# Altium footprint library 3.13-M3铜柱-散热片.PcbLib: 151 footprints (part 10 of 10)
Each footprint in its own frame and in the unit in brackets; x right, y up, seen from the top. Pads: shape width x height; smd on the part's side, far side on the other; paste and mask are expansions set on the pad; w line width, h text height; cw(c..) or ccw(c..) is an arc to the next point about the centre after c.
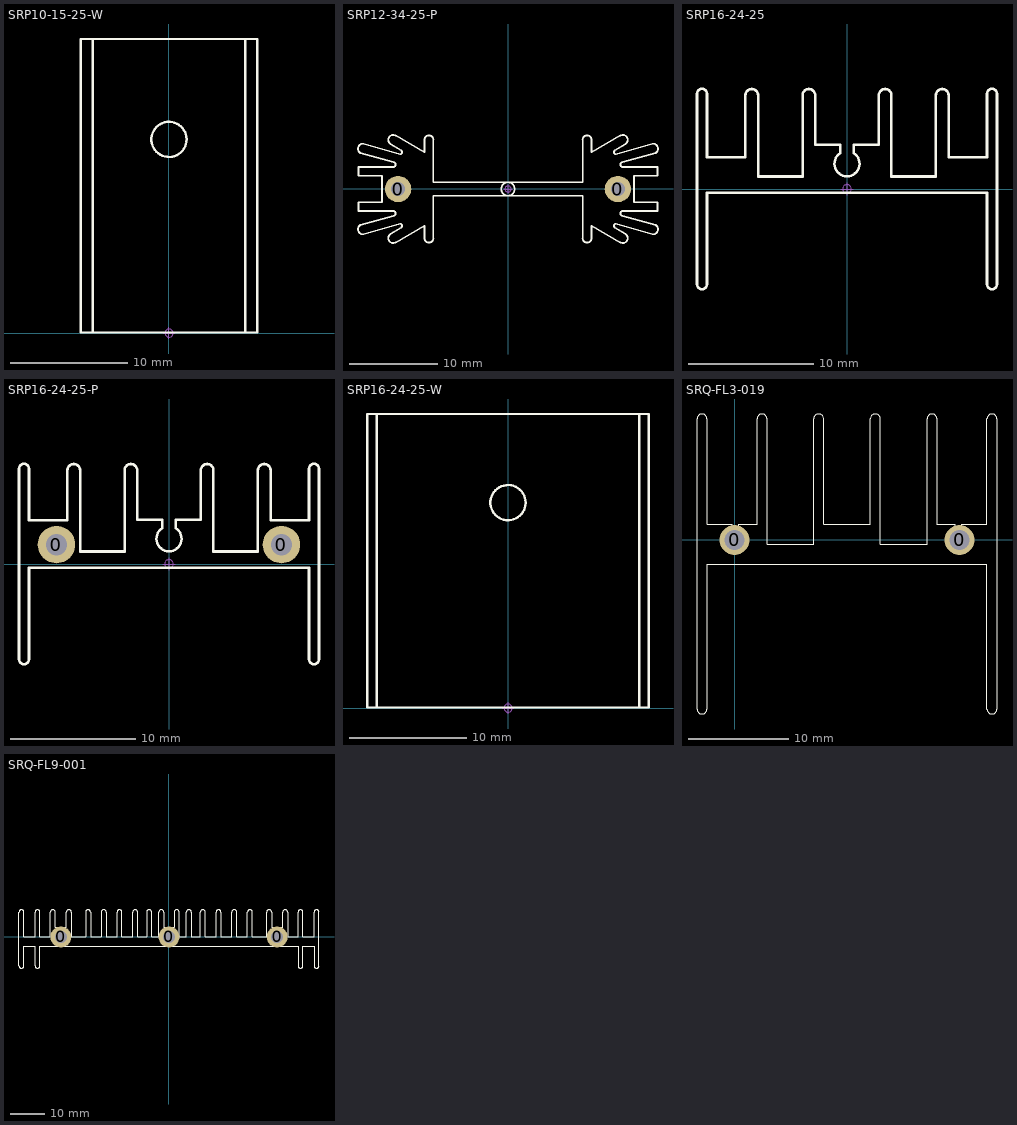
[diagram p9: the footprints below, top view; thin cyan lines are the x and y axes]

## SRP10-15-25-W [mil] "10mm*15mm*25mm(长*宽*高)"
Top Overlay:
  circle w8: c0,649.61 r59.06
  lines w8: -255.91,1.96 -255.91,984.25 ; 255.91,1.96 255.91,986.22 ; -295.27,1.96 295.28,1.96 295.28,986.22 -295.27,986.22 -295.27,1.96
Mechanical 15:
  circle w1.97: c0,0 r13.78
  lines w1.97: -19.68,0 19.68,0 ; 0,-19.68 0,19.68
3D body: height 395.67, standoff 1.97, extent -295.28,3.93 295.28,988.19

## SRP12-34-25-P [mm] "12mm*32mm*25mm(长*宽*高)"
pads (2):
  round 3 hole 1.6 unplated: 0(-12.5,-0.004) 0(12.5,-0.004)
Top Overlay:
  circle w0.203: c0,-0.004 r0.766
  lines w0.203: -14.326,-0.004 -14.326,-1.5 -17,-1.5 -17,-2.5 -13,-2.5 -13.047,-2.5 cw(c-13.059,-2.78) -13.047,-3.06 -16.802,-4.096 ccw(c-16.485,-4.576) -16.417,-5.147 -12.294,-3.95 cw(c-12.294,-4.195) -12.167,-4.404 -13.331,-5.107 ccw(c-13.056,-5.592) -12.807,-6.09 ; -14.326,0 -14.326,1.496 -17,1.496 -17,2.496 -13,2.496 -13.047,2.496 ccw(c-13.059,2.776) -13.047,3.056 -16.802,4.092 cw(c-16.485,4.572) -16.417,5.143 -12.294,3.946 ccw(c-12.294,4.191) -12.167,4.4 -13.331,5.103 cw(c-13.056,5.588) -12.807,6.086 ; -12.802,-6.1 -9.5,-4.195 -9.5,-5.592 ccw(c-8.992,-5.592) -8.484,-5.592 ; -12.802,6.096 -9.5,4.191 -9.5,5.588 cw(c-8.992,5.588) -8.484,5.588 ; -8.5,-5.592 -8.5,-0.762 8.5,-0.762 8.5,-5.592 ; -8.5,5.588 -8.5,0.762 8.5,0.762 8.5,5.588 ; 8.484,-5.592 ccw(c8.992,-5.592) 9.5,-5.592 9.5,-4.195 12.802,-6.1 ; 8.484,5.588 cw(c8.992,5.588) 9.5,5.588 9.5,4.191 12.802,6.096 ; 12.807,-6.09 ccw(c13.056,-5.592) 13.331,-5.107 12.167,-4.404 cw(c12.294,-4.195) 12.294,-3.95 16.417,-5.147 ccw(c16.485,-4.576) 16.802,-4.096 13.047,-3.06 cw(c13.059,-2.78) 13.047,-2.5 13,-2.5 17,-2.5 17,-1.5 14.326,-1.5 14.326,-0.004 ; 12.807,6.086 cw(c13.056,5.588) 13.331,5.103 12.167,4.4 ccw(c12.294,4.191) 12.294,3.946 16.417,5.143 cw(c16.485,4.572) 16.802,4.092 13.047,3.056 ccw(c13.059,2.776) 13.047,2.496 13,2.496 17,2.496 17,1.496 14.326,1.496 14.326,0
Mechanical 15:
  circle w0.05: c0,-0.004 r0.35
  lines w0.05: -0.5,-0.004 0.5,-0.004 ; 0,-0.504 0,0.496
3D body: height 25.05, standoff -3.45, extent -17.012,-6.071 17.012,6.063

## SRP16-24-25 [mil] "16mm*24mm*25mm(长*宽*高)"
Top Overlay:
  lines w8: -472.44,-300 ccw(c-456.69,-300) -440.94,-300 -440.94,-11.81 440.94,-11.81 440.94,-300 ccw(c456.69,-300) 472.44,-300 472.44,-11.81 472.44,300 ccw(c456.69,300) 440.94,300 440.94,100 320,100 320,294.96 ccw(c300,294.92) 280,294.96 280,39.37 140,39.37 140,294.96 ccw(c120,294.92) 100,294.96 100,140 20.87,140 20.87,113.33 cw(c0,79.64) -20.87,113.33 -20.87,140 -100,140 -100,294.96 ccw(c-120,294.92) -140,294.96 -140,39.37 -280,39.37 -280,295 ccw(c-300,294.96) -320,295 -320,100 -440.94,100 -440.94,300 ccw(c-456.69,300) -472.44,300 -472.44,-11.81 -472.44,-300
Mechanical 15:
  circle w1.97: c0,0 r13.78
  lines w1.97: -19.68,0 19.68,0 ; 0,-19.68 0,19.68
3D body: height 986.22, standoff 1.97, extent -472.44,-314.96 472.45,314.96

## SRP16-24-25-P [mm] "16mm*24mm*25mm(长*宽*高)"
pads (2):
  round 3 hole 1.7 unplated: 0(-9,1.55) 0(9,1.55)
Top Overlay:
  lines w0.203: -12,-7.62 ccw(c-11.6,-7.62) -11.2,-7.62 -11.2,-0.3 11.2,-0.3 11.2,-7.62 ccw(c11.6,-7.62) 12,-7.62 12,-0.3 12,7.62 ccw(c11.6,7.62) 11.2,7.62 11.2,3.5 8.128,3.5 8.128,7.492 ccw(c7.62,7.491) 7.112,7.492 7.112,1 3.556,1 3.556,7.492 ccw(c3.048,7.491) 2.54,7.492 2.54,3.556 0.53,3.556 0.53,2.879 cw(c0,2.023) -0.53,2.879 -0.53,3.556 -2.54,3.556 -2.54,7.492 ccw(c-3.048,7.491) -3.556,7.492 -3.556,1 -7.112,1 -7.112,7.493 ccw(c-7.62,7.492) -8.128,7.493 -8.128,3.5 -11.2,3.5 -11.2,7.62 ccw(c-11.6,7.62) -12,7.62 -12,-0.3 -12,-7.62
Mechanical 15:
  circle w0.05: c0,0 r0.35
  lines w0.05: -0.5,0 0.5,0 ; 0,-0.5 0,0.5
3D body: height 2.95, standoff -25.55, extent -12,-8 12,8

## SRP16-24-25-W [mil] "16mm*24mm*25mm(长*宽*高)"
Top Overlay:
  circle w8: c0,688.98 r59.06
  lines w8: -440,1.96 -440,986.22 ; 440,1.96 440,986.22 ; -472.44,1.96 472.44,1.96 472.44,986.22 -472.44,986.22 -472.44,1.96
Mechanical 15:
  circle w1.97: c0,0 r13.78
  lines w1.97: -19.68,0 19.68,0 ; 0,-19.68 0,19.68
3D body: height 631.89, standoff 1.97, extent -472.45,3.93 472.43,988.18

## SRQ-FL3-019 [mm] "淘宝ID:黄晶宝石   店铺网址:https://shop463601444.taobao.com"
pads (2):
  round 3 hole 2: 0(0,0) 0(22.5,0)
Top Overlay:
  lines w0.1: 20.25,1.592 22.05,1.592 22.05,0.461 ; 20.25,1.6 20.25,12.1 ccw(c19.75,12.1) 19.25,12.1 19.25,-0.4 14.583,-0.4 14.583,12.1 ccw(c14.083,12.1) 13.583,12.1 13.583,1.6 8.917,1.6 8.917,12.1 ccw(c8.417,12.1) 7.917,12.1 7.917,-0.4 3.25,-0.4 3.25,12.1 ccw(c2.75,12.1) 2.25,12.1 2.25,1.6 0.45,1.6 0.45,0.469 cw(c0,0) -0.25,0.6 -0.25,1.6 -2.75,1.6 -2.75,1.61 -2.75,12.1 ccw(c-3.25,12.1) -3.75,12.1 -3.75,-16.9 ccw(c-3.25,-16.9) -2.75,-16.9 -2.75,-2.4 25.25,-2.4 25.25,-16.9 ccw(c25.75,-16.9) 26.25,-16.9 26.25,12.1 ccw(c25.75,12.1) 25.25,12.1 25.25,1.602 ; 22.05,0.461 ccw(c22.5,-0.008) 22.75,0.592 ; 22.75,0.592 22.75,1.592 25.25,1.592 25.25,1.602 ; 25.25,1.6 25.25,1.602
3D body: height 25, standoff 0, extent -3.746,11.601 -2.75,12.599
3D body: height 25, standoff 0, extent 2.254,11.601 3.25,12.599
3D body: height 25, standoff 0, extent 7.921,11.601 8.917,12.599
3D body: height 25, standoff 0, extent 13.587,11.601 14.583,12.599
3D body: height 25, standoff 0, extent 19.254,11.601 20.25,12.599
3D body: height 25, standoff 0, extent 25.254,11.601 26.25,12.599
3D body: height 25, standoff 0, extent 25.254,-17.399 26.25,-16.401
3D body: height 25, standoff 0, extent -3.746,-17.399 -2.75,-16.401
3D body: height 25, standoff 0, extent 2.25,-2.407 20.25,12.1
3D body: height 25, standoff 0, extent 20.25,0.461 22.05,1.592
3D body: height 25, standoff 0, extent 22.75,0.592 25.25,1.592
3D body: height 25, standoff 0, extent 22.51,-2.4 25.25,-0.003
3D body: height 25, standoff 0, extent 20.25,-2.4 22.51,0.005
3D body: height 25, standoff 0, extent 20.25,0.005 22.05,0.461
3D body: height 25, standoff 0, extent 22.75,-0.003 25.25,0.595
3D body: height 25, standoff 0, extent -2.75,0.005 -0.25,0.603
3D body: height 25, standoff 0, extent 0.45,0.013 2.25,0.469
3D body: height 25, standoff 0, extent -0.01,-2.392 2.25,0.013
3D body: height 25, standoff 0, extent -2.75,-2.392 -0.01,0.005
3D body: height 25, standoff 0, extent -2.75,0.6 -0.25,1.6
3D body: height 25, standoff 0, extent 0.45,0.469 2.25,1.6
3D body: height 25, standoff 0, extent -3.746,-16.9 -2.75,12.1
3D body: height 25, standoff 0, extent 25.25,-16.9 26.25,12.1
3D body: height 8, standoff -5, extent -0.744,-0.748 0.75,0.749
3D body: height 8, standoff -5, extent 21.75,-0.757 23.244,0.74

## SRQ-FL9-001 [mm] "封装库来自淘宝卖家 ID：黄晶宝石"
pads (3):
  round 6 hole 3.5: 0(-31,0) 0(0,0) 0(31,0)
Top Overlay:
  lines w0.1: -31.827,0.937 ccw(c-31,0) -30.172,0.937 ; -31.8,0.937 -31.8,2.8 -32.6,2.8 -32.6,7.1 ccw(c-33.3,7.1) -34,7.1 -34,0 -37,0 -37,7.1 ccw(c-37.7,7.1) -38.4,7.1 -38.4,0 -41.6,0 -41.6,7.1 ccw(c-42.3,7.1) -43,7.1 -43,-8.3 ccw(c-42.3,-8.3) -41.6,-8.3 -41.6,-2.7 -38.4,-2.7 -38.4,-8.3 ccw(c-37.7,-8.3) -37,-8.3 -37,-2.7 37,-2.7 37,-8.3 ccw(c37.7,-8.3) 38.4,-8.3 38.4,-2.7 41.6,-2.7 41.6,-8.3 ccw(c42.3,-8.3) 43,-8.3 43,7.1 ccw(c42.3,7.1) 41.6,7.1 41.6,0 38.4,0 38.4,7.1 ccw(c37.7,7.1) 37,7.1 37,0 34,0 34,7.1 ccw(c33.3,7.1) 32.6,7.1 32.6,2.8 31.8,2.8 31.8,0.937 ; -30.2,0.937 -30.2,2.8 -29.4,2.8 -29.4,7.1 cw(c-28.7,7.1) -28,7.1 -28,0 -23.9,0 -23.9,7.1 cw(c-23.2,7.1) -22.5,7.1 -22.5,0 -19.4,0 -19.4,7.1 cw(c-18.7,7.1) -18,7.1 -18,0 -14.9,0 -14.9,7.1 cw(c-14.2,7.1) -13.5,7.1 -13.5,0 -10.4,0 -10.4,7.1 cw(c-9.7,7.1) -9,7.1 -9,0 -6.4,0 -6.4,7.1 cw(c-5.7,7.1) -5,7.1 -5,0 -2.9,0 -2.9,7.1 cw(c-2.2,7.1) -1.5,7.1 -1.5,2.8 -0.827,2.8 -0.827,0.937 ccw(c0,0) 0.828,0.937 0.828,2.8 1.5,2.8 1.5,7.1 cw(c2.2,7.1) 2.9,7.1 2.9,0 5,0 5,7.1 cw(c5.7,7.1) 6.4,7.1 ; 6.4,7.1 6.4,0 9,0 9,7.1 cw(c9.7,7.1) 10.4,7.1 10.4,0 13.5,0 13.5,7.1 cw(c14.2,7.1) 14.9,7.1 14.9,0 18,0 18,7.1 cw(c18.7,7.1) 19.4,7.1 19.4,0 22.5,0 22.5,7.1 cw(c23.2,7.1) 23.9,7.1 23.9,0 28,0 28,7.1 cw(c28.7,7.1) 29.4,7.1 29.4,2.8 30.2,2.8 30.2,0.937 ; 30.173,0.937 ccw(c31,0) 31.828,0.937
3D body: height 33, standoff 0, extent -43,-9 43,7.8